# Altium footprint library Connectors - Terminal Blocks - Headers Plugs and Sockets.PcbLib: 19 footprints (part 2 of 2)
Each footprint in its own frame and in the unit in brackets; x right, y up, seen from the top. Pads: shape width x height; smd on the part's side, far side on the other; paste and mask are expansions set on the pad; w line width, h text height; cw(c..) or ccw(c..) is an arc to the next point about the centre after c.
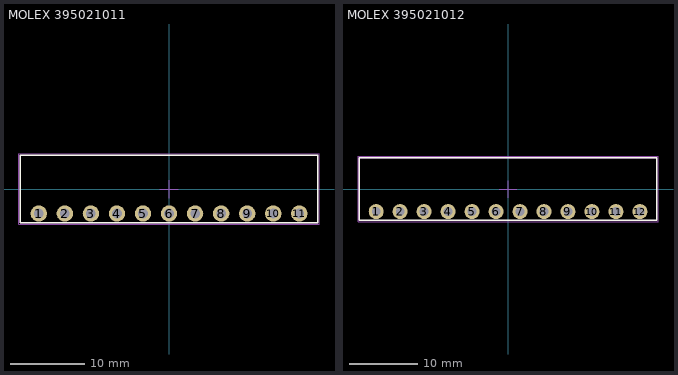
[diagram p1: the footprints below, top view; thin cyan lines are the x and y axes]

## MOLEX 395021011 [mil] "11 Position Terminal Block Header, Male Pins, 3.5mm Pitch,39.98mmx9.2mm Body, 90°, Right Angle, THT"
height 287.4
pads (11):
  round 86.61 hole 51: 1(-690,-130) 2(-552,-130) 3(-414,-130) 4(-276,-130) 5(-138,-130) 6(0,-130) 7(138,-130) 8(276,-130) 9(414,-130) 10(552,-130) 11(690,-130)
Top Overlay:
  lines w7.87: -787,-180 787,-180 787,180 -787,180 -787,-180
Mechanical 13:
  lines w3.94: -787,-180 -787,180 787,180 787,-180 -787,-180
Mechanical 15:
  lines w1.97: -794.88,-187.87 794.39,-187.87 794.39,187.87 -794.88,187.87 -794.88,-187.87
  lines w3.94: -49.21,0 0,0 ; 0,-49.21 0,0 ; 0,47.24 0,0 ; 49.21,0 0,0
3D body "Molex - 395021011 v1.step": height 280, standoff -140, extent -787,-180 787,180

## MOLEX 395021012 [mil] "12 Position Terminal Block Header, Male Pins, 3.5mm Pitch,43.485mmx9.2mm Body, 90°, Right Angle, THT"
height 287.4
pads (12):
  round 86.61 hole 51: 1(-759,-130) 2(-621,-130) 3(-483,-130) 4(-345,-130) 5(-207,-130) 6(-69,-130) 7(69,-130) 8(207,-130) 9(345,-130) 10(483,-130) 11(621,-130) 12(759,-130)
Top Overlay:
  lines w7.87: -856,-180 856,-180 856,180 -856,180 -856,-180
Mechanical 13:
  lines w3.94: -856,-180 -856,180 856,180 856,-180 -856,-180
Mechanical 15:
  lines w1.97: -863.86,-187.87 863.39,-187.87 863.39,187.87 -863.86,187.87 -863.86,-187.87
  lines w3.94: -49.21,0 0,0 ; 0,-49.21 0,0 ; 0,47.24 0,0 ; 49.21,0 0,0
3D body "Molex - 395021012 v1.step": height 280, standoff -140, extent -856,-180 856,180

## PCBComponent_1 [mm]